# Altium footprint library CTC1.PcbLib: 19 footprints (part 1 of 2)
Each footprint in its own frame and in the unit in brackets; x right, y up, seen from the top. Pads: shape width x height; smd on the part's side, far side on the other; paste and mask are expansions set on the pad; w line width, h text height; cw(c..) or ccw(c..) is an arc to the next point about the centre after c.
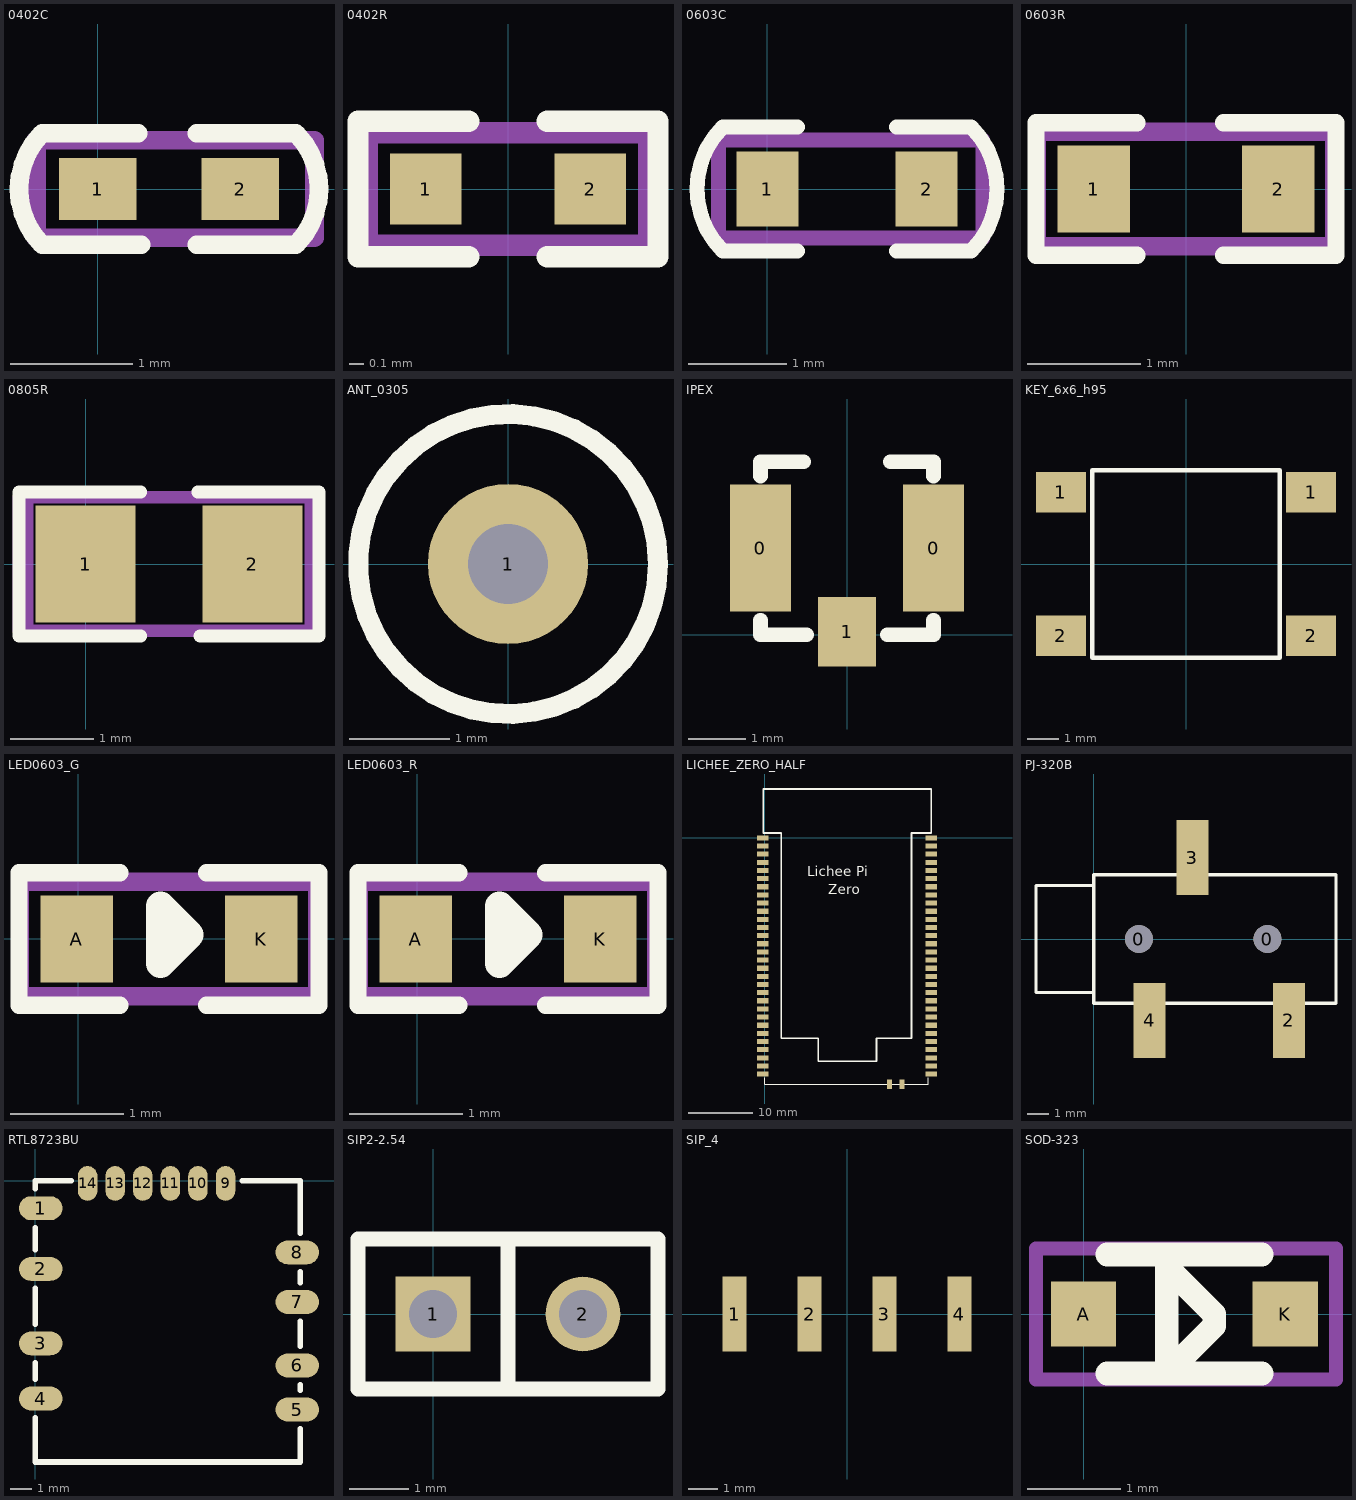
[diagram p0: the footprints below, top view; thin cyan lines are the x and y axes]

## 0402C [mil]
pads (2):
  rect 25x20 smd: 1(0,0) 2(46,0)
Top Overlay:
  lines w6: -18,-18 cw(c0,0) -18,18 13,18 ; -17,-18 14,-18 ; 32,-18 64,-18 ccw(c46,0) 64,18 32,18
Mechanical 13:
  lines w6: -20,-15.75 70,-15.75 70,15.75 -20,15.75 -20,-15.75
  text ".Designator" at -10,-10 h20
Mechanical 15:
  lines w6: -19.68,-15.75 -19.68,15.75 70,15.75 70,-15.75 -19.68,-15.75
  text ".Comment" at -10,-10 h20
3D body "0402 SMD Capacitor.step": height 7.95, standoff 0, extent 3.94,-11.81 43.31,11.81

## 0402R [mil]
pads (2):
  rect 20x20 smd: 1(-23,0) 2(23,0)
Top Overlay:
  lines w6: -11,-19 -42,-19 -42,19 -11,19 ; 11,-19 42,-19 42,19 11,19
Mechanical 13:
  lines w6: -39.37,-15.75 -39.37,15.75 39.37,15.75 39.37,-15.75 -39.37,-15.75
  text ".Designator" at -35.43,-7.87 h20
Mechanical 15:
  lines w6: -39.37,-15.75 39.37,-15.75 39.37,15.75 -39.37,15.75 -39.37,-15.75
  text ".Comment" at -35.43,-11.81 h20
3D body "User Library-RES_1005-0402.STEP": height 16.14, standoff 0, extent -22.63,-10.82 22.64,10.83

## 0603C [mil]
pads (2):
  rect 25x30 smd: 1(0,0) 2(64,0)
Top Overlay:
  lines w6: 12,-25 -18,-25 cw(c7,0) -18,25 12,25 ; 52,-25 82,-25 ccw(c57,0) 82,25 52,25
Mechanical 13:
  lines w6: -19.68,-19.68 86.61,-19.68 86.61,19.68 -19.68,19.68 -19.68,-19.68
  text ".Designator" at -15.75,-7.87 h20
Mechanical 15:
  lines w6: -19.68,-19.68 -19.68,19.68 86.61,19.68 86.61,-19.68 -19.68,-19.68
  text ".Comment" at -15.75,-7.87 h20
3D body "User Library-0603 SMD Capacitor.STEP": height 11.89, standoff 0, extent 0,-15.75 62.99,15.75

## 0603R [mil]
pads (2):
  rect 25x30 smd: 1(-32,0) 2(32,0)
Top Overlay:
  lines w6: -17,-23 -52,-23 -52,23 -17,23 ; 13,-23 52,-23 52,23 13,23
Mechanical 13:
  lines w6: -51.5,-20 -51.5,20 51.18,20 51.18,-20 -51.5,-20
  text ".Designator" at -43.31,-7.87 h20
Mechanical 15:
  lines w6: -51.5,-19.68 51.18,-19.68 51.18,19.68 -51.5,19.68 -51.5,-19.68
  text ".Comment" at -43.31,-7.87 h20
3D body "User Library-RES_1609-0603.STEP": height 22.05, standoff 0, extent -33.46,-15.74 33.47,15.75

## 0805R [mm]
pads (2):
  rect 1.2x1.4 smd: 1(0,0) 2(2,0)
Top Overlay:
  lines w0.152: 0.66,-0.864 -0.8,-0.864 -0.8,0.864 0.66,0.864 ; 1.346,0.864 2.8,0.864 2.8,-0.864 1.372,-0.864
Mechanical 13:
  lines w0.152: -0.7,-0.8 -0.7,0.8 2.7,0.8 2.7,-0.8 -0.7,-0.8
  text ".Designator" at -0.6,-0.2 h0.51
Mechanical 15:
  lines w0.152: -0.8,-0.8 2.7,-0.8 2.7,0.8 -0.8,0.8 -0.8,-0.8
  text ".Comment" at -0.6,-0.2 h0.51
3D body "User Library-0805 SMD R.STEP": height 0.77, standoff -0.01, extent 0,-0.625 2,0.625

## ANT_0305 [mm]
pads (1):
  round 1.6 hole 0.8: 1(0,0)
Top Overlay:
  circle w0.2: c0,0 r1.5
3D body: height 5, standoff 0, extent -1.5,-1.5 1.5,1.5

## IPEX [mm]
pads (3):
  rect 1.05x2.2 smd: 0(-1.5,1.5) 0(1.5,1.5)
  rect 1x1.2 smd: 1(0,0.05)
Top Overlay:
  lines w0.254: -1.5,0.25 -1.5,0 -0.7,0 ; -1.5,2.75 -1.5,3 -0.75,3 ; 0.7,0 1.5,0 1.5,0.25 ; 0.75,3 1.5,3 1.5,2.75
3D body: height 0.5, standoff 0, extent -1.524,0 1.524,3.048
3D body: height 1, standoff 0.5, extent -1,0.524 1,2.524

## KEY_6x6_h95 [mm]
pads (4):
  rect 1.6x1.3 smd: 1(-4,2.3) 1(4,2.3) 2(-4,-2.3) 2(4,-2.3)
Top Overlay:
  lines w0.152: -3,-3 3,-3 3,3 -3,3 -3,-3
3D body "User Library-PTS645SL95SMTR92-LFS.STEP": height 9.5, standoff 0, extent -4.5,-3 4.5,3

## LED0603_G [mil]
pads (2):
  rect 25x30 smd: A(-0.51,-0.01) K(63.49,-0.01)
Top Overlay:
  lines w6: 14.49,-23.01 -20.51,-23.01 -20.51,22.99 14.49,22.99 ; 44.49,-23.01 83.49,-23.01 83.49,22.99 44.49,22.99
  lines w10: 28.5,-8.51 28.5,11.49 38.5,1.49 28.5,-8.51
Mechanical 13:
  lines w6: -20.01,-20.01 82.67,-20.01 82.67,19.99 -20.01,19.99 -20.01,-20.01
  text ".Designator" at -7.88,-7.87 h20
Mechanical 15:
  lines w6: -20.01,-19.69 -20.01,19.68 82.67,19.68 82.67,-19.69 -20.01,-19.69
  text ".Comment" at -7.88,-7.87 h20
3D body "User Library-LED_0603_G.STEP": height 23.62, standoff -0.08, extent 0.01,-15.74 63,15.75

## LED0603_R [mil]
pads (2):
  rect 25x30 smd: A(-0.51,-0.01) K(63.49,-0.01)
Top Overlay:
  lines w6: 14.49,-23.01 -20.51,-23.01 -20.51,22.99 14.49,22.99 ; 44.49,-23.01 83.49,-23.01 83.49,22.99 44.49,22.99
  lines w10: 28.5,-8.51 28.5,11.49 38.5,1.49 28.5,-8.51
Mechanical 13:
  lines w6: -20.01,-20.01 82.67,-20.01 82.67,19.99 -20.01,19.99 -20.01,-20.01
  text ".Designator" at -7.88,-7.87 h20
Mechanical 15:
  lines w6: -20.01,-19.69 -20.01,19.68 82.67,19.68 82.67,-19.69 -20.01,-19.69
  text ".Comment" at -7.88,-7.87 h20
3D body "User Library-LED_0603_R.STEP": height 23.62, standoff -0.08, extent 0,-15.75 63,15.75

## LICHEE_ZERO_HALF [mm]
pads (62):
  rect 1.8x0.8 smd: 1(-0.3,0) 2(-0.3,-1.27) 3(-0.3,-2.54) 4(-0.3,-3.81) 5(-0.3,-5.08) 6(-0.3,-6.35) 7(-0.3,-7.62) 8(-0.3,-8.89) 9(-0.3,-10.16) 10(-0.3,-11.43) 11(-0.3,-12.7) 12(-0.3,-13.97) 13(-0.3,-15.24) 14(-0.3,-16.51) 15(-0.3,-17.78) 16(-0.3,-19.05) 17(-0.3,-20.32) 18(-0.3,-21.59) 19(-0.3,-22.86) 20(-0.3,-24.13) 21(-0.3,-25.4) 22(-0.3,-26.67) 23(-0.3,-27.94) 24(-0.3,-29.21) 25(-0.3,-30.48) 26(-0.3,-31.75) 27(-0.3,-33.02) 28(-0.3,-34.29) 29(-0.3,-35.56) 30(-0.3,-36.83) 31(25.9,-36.83) 32(25.9,-35.56) 33(25.9,-34.29) 34(25.9,-33.02) 35(25.9,-31.75) 36(25.9,-30.48) 37(25.9,-29.21) 38(25.9,-27.94) 39(25.9,-26.67) 40(25.9,-25.4) 41(25.9,-24.13) 42(25.9,-22.86) 43(25.9,-21.59) 44(25.9,-20.32) 45(25.9,-19.05) 46(25.9,-17.78) 47(25.9,-16.51) 48(25.9,-15.24) 49(25.9,-13.97) 50(25.9,-12.7) 51(25.9,-11.43) 52(25.9,-10.16) 53(25.9,-8.89) 54(25.9,-7.62) 55(25.9,-6.35) 56(25.9,-5.08) 57(25.9,-3.81) 58(25.9,-2.54) 59(25.9,-1.27) 60(25.9,0)
  rect 0.8x1.5 smd: 61(21.4,-38.4) 62(19.4,-38.4)
Top Overlay:
  lines w0.152: 0,-37.4 0,-38.4 25.5,-38.4 25.5,-37.4
  lines w0.254: 8.298,-31.24 2.54,-31.24 2.54,0.762 -0.254,0.762 -0.254,7.62 25.908,7.62 25.908,0.762 22.86,0.762 22.86,0.508 22.86,-31.24 ; 8.3,-31.242 8.3,-34.798 17.4,-34.798 17.4,-31.242 22.858,-31.242
  text "Lichee Pi" at 6.604,-6.006 h1.52
  text "Zero" at 9.906,-8.8 h1.52
3D body "lichee_zero.step": height 5.35, standoff -2.17, extent 0,-39.647 25.552,6.35

## PJ-320B [mm]
pads (5):
  round 1.3 hole 1.3: 0(2.1,0) 0(8.1,0)
  rect 1.5x3.5 smd: 2(9.1,-3.8) 3(4.6,3.8) 4(2.6,-3.8)
Top Overlay:
  lines w0.152: 0,-2.5 -2.7,-2.5 -2.7,2.5 0,2.5 0,-3 11.3,-3 11.3,3 0,3 0,2.1
3D body: height 0.2, standoff 0, extent 4.1,3 5.1,5.2
3D body: height 0.2, standoff 0, extent 8.6,-5.2 9.6,-3
3D body: height 0.2, standoff 0, extent 2.1,-5.2 3.1,-3
3D body: height 5, standoff 0, extent -2.7,-2.5 0,2.5
3D body: height 5, standoff 0, extent 0,-3 11.3,3

## RTL8723BU [mm]
pads (14):
  oval 2x1.1 smd: 1(0.254,-1.27) 2(0.254,-4.064) 3(0.254,-7.493) 4(0.254,-10.033) 5(12.065,-10.541) 6(12.065,-8.509) 7(12.065,-5.588) 8(12.065,-3.302)
  oval 0.9x1.6 smd: 9(8.763,-0.127) 10(7.493,-0.127) 11(6.223,-0.127) 12(4.953,-0.127) 13(3.683,-0.127) 14(2.413,-0.127)
Top Overlay:
  lines w0.254: 0,-10.922 0,-12.954 12.192,-12.954 12.192,-11.43 ; 0,-9.144 0,-8.382 ; 0,-6.604 0,-4.953 ; 0,-3.175 0,-2.159 ; 0,-0.381 0,0 1.651,0 ; 9.525,0 12.192,0 12.192,-2.413 ; 12.192,-9.652 12.192,-9.398 ; 12.192,-7.62 12.192,-6.477 ; 12.192,-4.699 12.192,-4.191
3D body: height 1.5, standoff 0.5, extent 0,-12.9 12.2,0

## SIP2-2.54 [mil]
pads (2):
  rect 50x50 hole 32: 1(0,0)
  round 50 hole 32: 2(100,0)
Top Overlay:
  lines w10: 50,-50 50,50 ; -50,-50 -50,50 150,50 150,-50 -50,-50

## SIP_4 [mm]
pads (4):
  rect 0.8x2.54 smd: 1(-3.81,0) 2(-1.27,0) 3(1.27,0) 4(3.81,0)

## SOD-323 [mm]
pads (2):
  rect 0.7x0.7 smd: A(0,0) K(2.159,0)
Top Overlay:
  lines w0.254: 0.254,-0.635 1.905,-0.635 ; 0.254,0.635 1.905,0.635 ; 0.889,-0.635 0.889,0.508 1.397,0 1.397,-0.127 0.889,-0.635
Mechanical 13:
  lines w0.152: -0.508,-0.7 2.7,-0.7 2.7,0.7 -0.508,0.7 -0.508,-0.7
  text ".Designator" at -0.254,-0.254 h0.51
Mechanical 15:
  lines w0.152: -0.508,-0.7 -0.508,0.7 2.7,0.7 2.7,-0.7 -0.508,-0.7
  text ".Comment" at -0.254,-0.254 h0.51
3D body "User Library-SOD882-1.step": height 0.48, standoff -0.03, extent 0.608,-0.292 1.593,0.293